# Altium schematic symbol library GyokuRe.SchLib: 1131 symbols (part 3 of 8) (continued)
## CON.header 2x20 (continued)
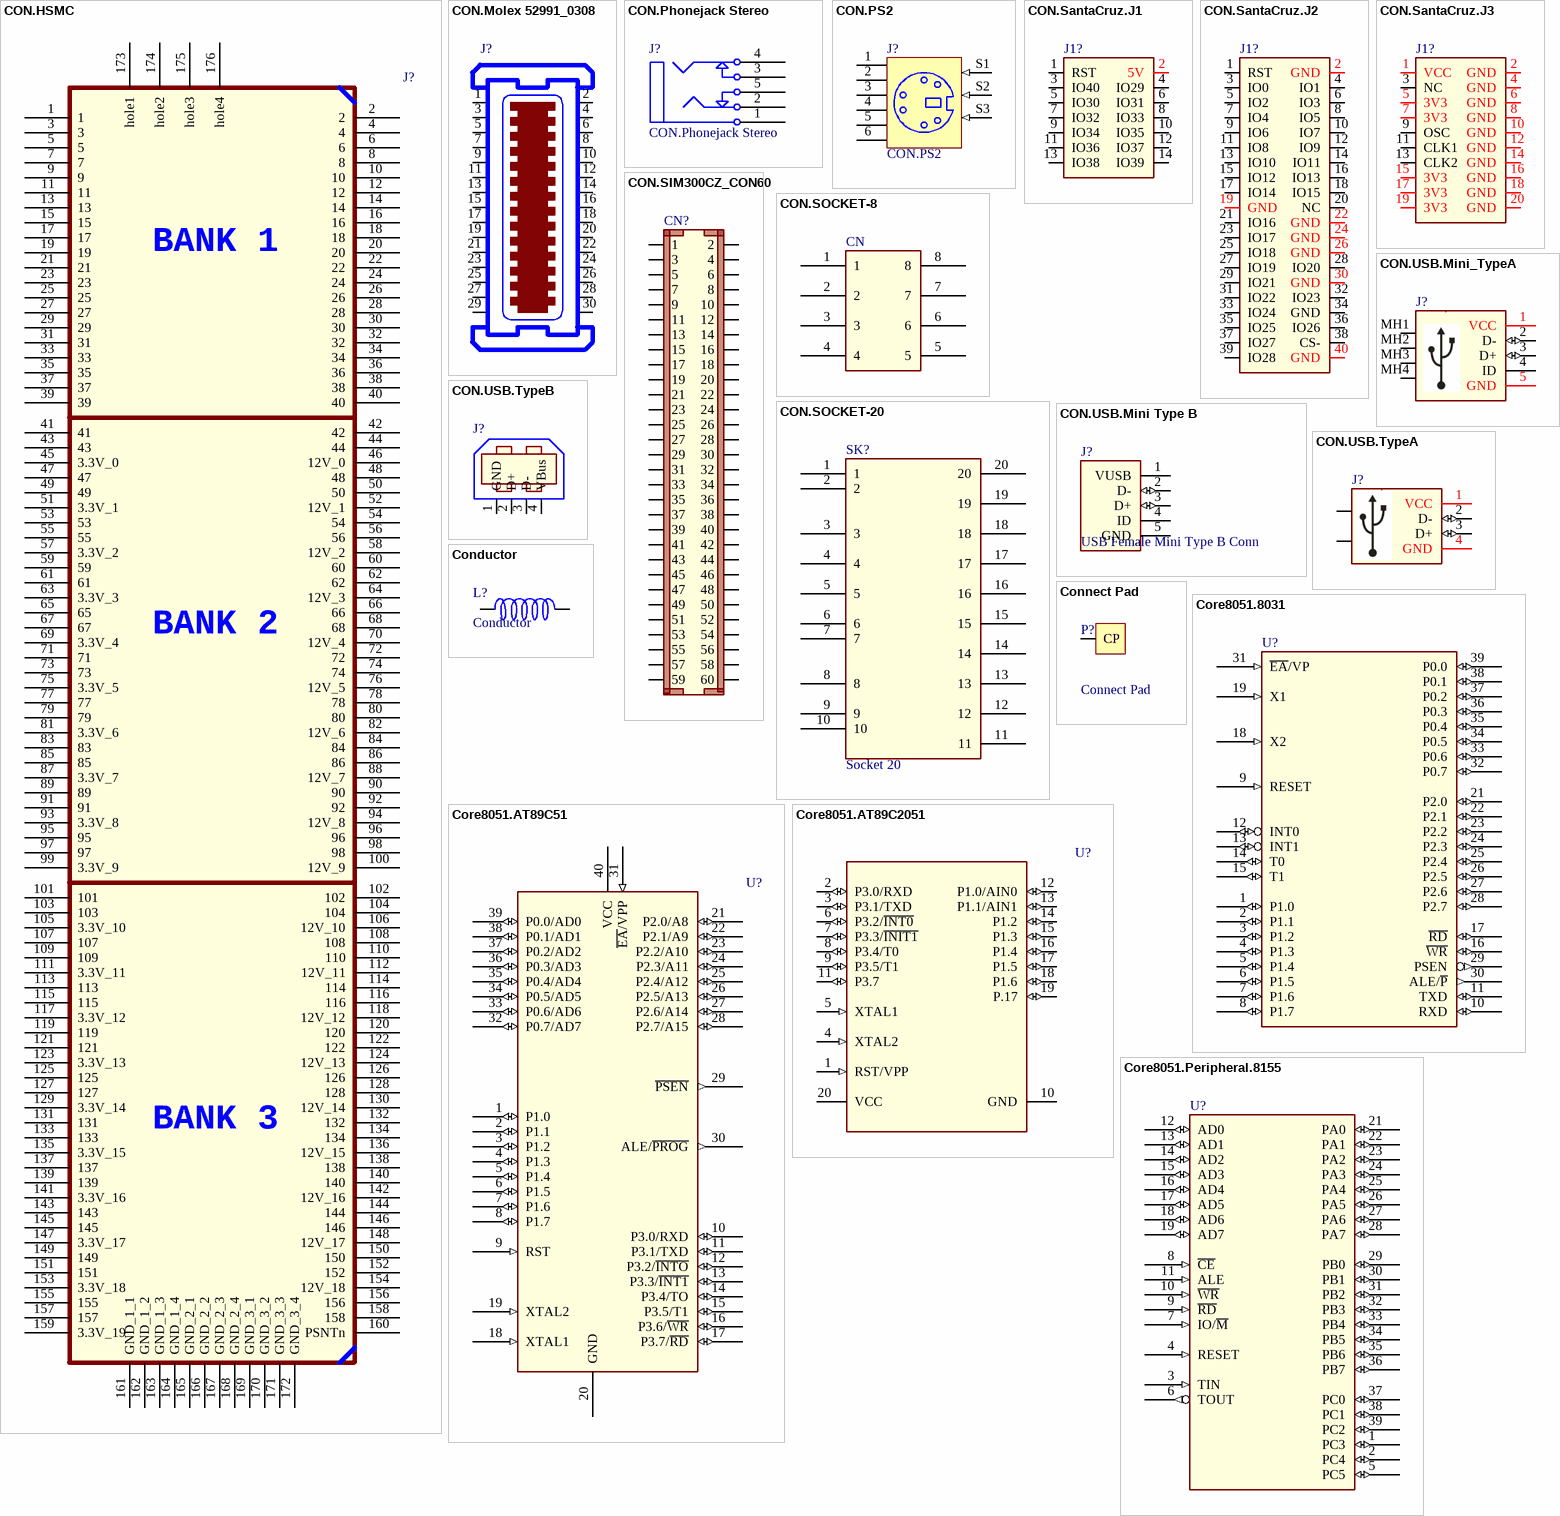
[diagram p14: symbols CON.HSMC to Core8051.Peripheral.8155]

## CON.HSMC
designator J?  (value not drawn)
HSMC Connector; Manufacturer: SamTec; Publisher: Hoang Nguyen; ComponentLink1Description: Digikey Part link; ComponentLink2Description: Open DataSheet; ComponentLink2URL: H:\LIBRARY\LIBRARY.Datasheet\
footprint CON.ASP-122952-01 (HSMC Male Connector)
pins: 1, 2, 3, 4, 5, 6, 7, 8, 9, 10, 11, 12, 13, 14, 15, 16, 17, 18, 19, 20, 21, 22, 23, 24, 25, 26, 27, 28, 29, 30, 31, 32, 33, 34, 35, 36, 37, 38, 39, 40, 41, 42, 43, 44, 45 3.3V_0, 46 12V_0, 47, 48, 49, 50, 51 3.3V_1, 52 12V_1, 53, 54, 55, 56, 57 3.3V_2, 58 12V_2, 59, 60, 61, 62, 63 3.3V_3, 64 12V_3, 65, 66, 67, 68, 69 3.3V_4, 70 12V_4, 71, 72, 73, 74, 75 3.3V_5, 76 12V_5, 77, 78, 79, 80, 81 3.3V_6, 82 12V_6, 83, 84, 85, 86, 87 3.3V_7, 88 12V_7, 89, 90, 91, 92, 93 3.3V_8, 94 12V_8, 95, 96, 97, 98, 99 3.3V_9, 100 12V_9, 101, 102, 103, 104, 105 3.3V_10, 106 12V_10, 107, 108, 109, 110, 111 3.3V_11, 112 12V_11, 113, 114, 115, 116, 117 3.3V_12, 118 12V_12, 119, 120, 121, 122, 123 3.3V_13, 124 12V_13, 125, 126, 127, 128, 129 3.3V_14, 130 12V_14, 131, 132, 133, 134, 135 3.3V_15, 136 12V_15, 137, 138, 139, 140, 141 3.3V_16, 142 12V_16, 143, 144, 145, 146, 147 3.3V_17, 148 12V_17, 149, 150, 151, 152, 153 3.3V_18, 154 12V_18, 155, 156, 157, 158, 159 3.3V_19, 160 PSNTn, 161 GND_1_1 (power), 162 GND_1_2 (power), 163 GND_1_3 (power), 164 GND_1_4 (power), 165 GND_2_1 (power), 166 GND_2_2 (power), 167 GND_2_3 (power), 168 GND_2_4 (power), 169 GND_3_1 (power), 170 GND_3_2 (power), 171 GND_3_3 (power), 172 GND_3_4 (power), 173 hole1, 174 hole2, 175 hole3, 176 hole4
text: BANK 1; BANK 2; BANK 3

## CON.Molex 52991_0308
designator J?  (value not drawn)
0.50mm (.020") Pitch SlimStack(TM) Receptacle, Surface Mount, Dual Row, Vertical; Manufacturer: Molex Corporation; Manufacturer P/N: 52991-0308; Voltage - Maximum: 50V; Current - Maximum: 500mA; Vendor: Digikey; Vendor P/N: 52991-0308-ND; Publisher: Hoang Nguyen; Temperature Range - Operating: -40°C to +105°C; Termination Interface: Surface Mount; ComponentLink1Description: Digikey Part link; ComponentLink1URL: http://search.digikey.com/scripts/DkSearch/dksus.dll?Detail&name=52991-0308-ND; ComponentLink2URL: http://www.molex.com/molex/products/datasheet.jsp?part=active/0529910308_PCB_RECEPTACLES.xml&channel=Products&Lang=en-US; ComponentLink2Description: Manufacture Link
footprint CON.Molex 52991_0308 (0.50mm (.020") Pitch SlimStack(TM) Receptacle, Surface Mount, Dual Row, Vertical)
pins: 1, 2, 3, 4, 5, 6, 7, 8, 9, 10, 11, 12, 13, 14, 15, 16, 17, 18, 19, 20, 21, 22, 23, 24, 25, 26, 27, 28, 29, 30

## CON.Phonejack Stereo
designator J?
3.5mm Audio Jack, Stereo; Published: 5-Jan-2004; DatasheetDocument: 07-Mar-2000; Publisher: Altium Limited; Mounting Type: Through Hole; ComponentLink1Description: Digikey Part link; ComponentLink2Description: Open DataSheet; ComponentLink2URL: H:\LIBRARY\LIBRARY.Datasheet\
footprint ST-3150-5N (Stereo Jack, 3.5mm, 5 Position)
pcadlib ST-3150-5N (Stereo Jack, 3.5mm, 5 Position)
pins: 1, 1A, 1B, 2, 2A, 2B, 3, 3A, 3B, 4, 4A, 4B, 5, 5A, 5B

## CON.PS2
designator J?
6 Pin Through Hole PS2 Socket (Kycon P/N); Published: 5-Jan-2004; Publisher: Altium Limited; ComponentLink1Description: Digikey Part link; ComponentLink2Description: Open DataSheet; ComponentLink2URL: H:\LIBRARY\LIBRARY.Datasheet\
footprint PS2-6PIN (PS2 Socket, 6 Pin, Through Hole)
pcadlib PS2-6PIN (PS2 Socket, 6 Pin, Through Hole)
pins: 1 KBD "Keyboard Data", 2 MSD "Mouse Data", 3 GND (power), 4 VCC (power), 5 KBC "Keyboard Clock", 6 MSC "Mouse Clk", S1 (in) "Shield", S2 (in) "Shield", S3 (in) "Shield"

## CON.SantaCruz.J1
designator J1?  (value not drawn)
SantaCruz.J1; Publisher: Hoang Nguyen; ComponentLink1Description: Digikey Part link; ComponentLink2Description: Open DataSheet; ComponentLink2URL: H:\LIBRARY\LIBRARY.Datasheet\
footprint HDR2X7
pins: 1 RST, 2 5V, 3 IO40, 4 IO29, 5 IO30, 6 IO31, 7 IO32, 8 IO33, 9 IO34, 10 IO35, 11 IO36, 12 IO37, 13 IO38, 14 IO39

## CON.SantaCruz.J2
designator J1?  (value not drawn)
SantaCruz.J2; Publisher: Hoang Nguyen; ComponentLink1Description: Digikey Part link; ComponentLink2Description: Open DataSheet; ComponentLink2URL: H:\LIBRARY\LIBRARY.Datasheet\
footprint HDR2X20
pins: 1 RST, 2 GND, 3 IO0, 4 IO1, 5 IO2, 6 IO3, 7 IO4, 8 IO5, 9 IO6, 10 IO7, 11 IO8, 12 IO9, 13 IO10, 14 IO11, 15 IO12, 16 IO13, 17 IO14, 18 IO15, 19 GND, 20 NC, 21 IO16, 22 GND, 23 IO17, 24 GND, 25 IO18, 26 GND, 27 IO19, 28 IO20, 29 IO21, 30 GND, 31 IO22, 32 IO23, 33 IO24, 34 GND, 35 IO25, 36 IO26, 37 IO27, 38 CS-, 39 IO28, 40 GND

## CON.SantaCruz.J3
designator J1?  (value not drawn)
SantaCruz.J3; Publisher: Hoang Nguyen; ComponentLink1Description: Digikey Part link; ComponentLink2Description: Open DataSheet; ComponentLink2URL: H:\LIBRARY\LIBRARY.Datasheet\
footprint HDR2X10
pins: 1 VCC, 2 GND, 3 NC, 4 GND, 5 3V3, 6 GND, 7 3V3, 8 GND, 9 OSC, 10 GND, 11 CLK1, 12 GND, 13 CLK2, 14 GND, 15 3V3, 16 GND, 17 3V3, 18 GND, 19 3V3, 20 GND

## CON.SIM300CZ_CON60
designator CN?  (value not drawn)
60 pins SIM300CZ; Publisher: Hoang Nguyen; ComponentLink1Description: Digikey Part link; ComponentLink2Description: Open DataSheet; ComponentLink2URL: H:\LIBRARY\LIBRARY.Datasheet\
footprint ASTRON 1590060-093
pins: 1, 2, 3, 4, 5, 6, 7, 8, 9, 10, 11, 12, 13, 14, 15, 16, 17, 18, 19, 20, 21, 22, 23, 24, 25, 26, 27, 28, 29, 30, 31, 32, 33, 34, 35, 36, 37, 38, 39, 40, 41, 42, 43, 44, 45, 46, 47, 48, 49, 50, 51, 52, 53, 54, 55, 56, 57, 58, 59, 60

## CON.SOCKET-8
designator CN, comment Socket 8  (value not drawn)
ComponentLink1Description: Digikey Part link; ComponentLink2Description: Open DataSheet; ComponentLink2URL: H:\LIBRARY\LIBRARY.Datasheet\
footprint IC8N (Footprint not found)
pins: 1, 2, 3, 4, 5, 6, 7, 8

## CON.SOCKET-20
designator SK?, comment Socket 20
ComponentLink1Description: Digikey Part link; ComponentLink2Description: Open DataSheet; ComponentLink2URL: H:\LIBRARY\LIBRARY.Datasheet\
footprint IC20N
pins: 1, 2, 3, 4, 5, 6, 7, 8, 9, 10, 11, 12, 13, 14, 15, 16, 17, 18, 19, 20

## CON.USB.Mini Type B
designator J?, comment USB Female Mini Type B Conn
USB Mini Type B Conn; Vendor: Digikey; Published: 13-April-2009; Publisher: Hoang Nguyen; ComponentLink1Description: Digikey Part Link; ComponentLink2Description: Open Datasheet; ComponentLink2URL: H:\LIBRARY\LIBRARY.Datasheet\
footprint USB Male Mini Type-B SMD (USB Male Mini Type B Conn)
footprint USB Mini B 1 (USB Male Mini Type B Conn)
pins: 1 VUSB (power), 2 D- (io), 3 D+ (io), 4 ID "Mini Type B - Not connected", 5 GND (power)

## CON.USB.Mini_TypeA
designator J?  (value not drawn)
Mini USB Type A Connector; Publisher: Hoang Nguyen; ComponentLink1Description: Digikey Part link; ComponentLink2Description: Open DataSheet; ComponentLink2URL: H:\LIBRARY\LIBRARY.Datasheet\
footprint USB Type A (Footprint not found)
pins: 1 VCC (power), 2 D- (io), 3 D+ (io), 4 ID (power) "Mini Type A - Connected to GND", 5 GND (power), MH1, MH2, MH3, MH4

## CON.USB.TypeA
designator J?  (value not drawn)
Type-A USB Connector; Publisher: Hoang Nguyen; ComponentLink1Description: Digikey Part link; ComponentLink2Description: Open DataSheet; ComponentLink2URL: H:\LIBRARY\LIBRARY.Datasheet\
footprint USB Male Type-A (USB Male Type A Connector)
pins: 1 VCC (power), 2 D- (io), 3 D+ (io), 4 GND (power), SHIELD, SHIELD

## CON.USB.TypeB
designator J?, comment USB Type B Conn  (value not drawn)
Vendor: Digikey; Published: 13-April-2009; Publisher: Hoang Nguyen; ComponentLink1Description: Digikey Part Link; ComponentLink2Description: Open Datasheet; ComponentLink2URL: H:\LIBRARY\LIBRARY.Datasheet\
footprint USB Male Type-B (USB Male Type B Connector)
footprint USB TypeB 2 (USB Male Type B Connector)
pins: 1 GND, 2 D+, 3 D-, 4 VBus

## Conductor
designator L?
footprint CUON CAM 200mil
pins: 1, 2

## Connect Pad
designator P?
Connect Pad, 1-Pin; LatestRevisionDate: 17-Jul-2002; LatestRevisionNote: Re-released for DXP Platform.; Publisher: Altium Limited
footprint CP (Connect Pad, 1-Pin)
pins: 1 CP

## Core8051.8031
designator U?  (value not drawn)
Intel 8031; Flash: Kb; SRAM: Bytes; Volt: V; CPU Speed (MIPS): 0 MIPS; Publisher: Hoang Nguyen; ComponentLink1Description: Degikey Part link; ComponentLink2Description: Open DataSheet; ComponentLink2URL: H:\LIBRARY\LIBRARY.Datasheet\
pins: 1 P1.0 (io), 2 P1.1 (io), 3 P1.2 (io), 4 P1.3 (io), 5 P1.4 (io), 6 P1.5 (io), 7 P1.6 (io), 8 P1.7 (io), 9 RESET (in), 10 RXD (io), 11 TXD (io), 12 INT0 (io), 13 INT1 (io), 14 T0 (io), 15 T1 (io), 16 ~{WR} (io), 17 ~{RD} (io), 18 X2 (in), 19 X1 (in), 20 VSS (power) hidden to VSS, 21 P2.0 (io), 22 P2.1 (io), 23 P2.2 (io), 24 P2.3 (io), 25 P2.4 (io), 26 P2.5 (io), 27 P2.6 (io), 28 P2.7 (io), 29 PSEN (out), 30 ALE/~{P} (out), 31 ~{EA}/VP (in), 32 P0.7 (io), 33 P0.6 (io), 34 P0.5 (io), 35 P0.4 (io), 36 P0.3 (io), 37 P0.2 (io), 38 P0.1 (io), 39 P0.0 (io), 40 VCC (power) hidden to VCC

## Core8051.AT89C51
designator U?  (value not drawn)
Atmel MCU; Flash: Kb; SRAM: Bytes; Volt: V; CPU Speed (MIPS): 0 MIPS; ComponentLink1Description: Degikey Part link; ComponentLink2Description: Open DataSheet; ComponentLink2URL: H:\LIBRARY\LIBRARY.Datasheet\; Publisher: Hoang Nguyen
footprint DIP600-40 (DIP, Plastic; 40 Leads; Row Spacing 15.24 mm; Pitch 2.54 mm)
pins: 1 P1.0 (io), 2 P1.1 (io), 3 P1.2 (io), 4 P1.3 (io), 5 P1.4 (io), 6 P1.5 (io), 7 P1.6 (io), 8 P1.7 (io), 9 RST (in), 10 P3.0/RXD (io), 11 P3.1/TXD (io), 12 P3.2/~{INTO} (io), 13 P3.3/~{INT1} (io), 14 P3.4/TO (io), 15 P3.5/T1 (io), 16 P3.6/~{WR} (io), 17 P3.7/~{RD} (io), 18 XTAL1 (in), 19 XTAL2 (in), 20 GND (power), 21 P2.0/A8 (io), 22 P2.1/A9 (io), 23 P2.2/A10 (io), 24 P2.3/A11 (io), 25 P2.4/A12 (io), 26 P2.5/A13 (io), 27 P2.6/A14 (io), 28 P2.7/A15 (io), 29 ~{PSEN} (out), 30 ALE/~{PROG} (out), 31 ~{EA}/VPP (in), 32 P0.7/AD7 (io), 33 P0.6/AD6 (io), 34 P0.5/AD5 (io), 35 P0.4/AD4 (io), 36 P0.3/AD3 (io), 37 P0.2/AD2 (io), 38 P0.1/AD1 (io), 39 P0.0/AD0 (io), 40 VCC (power)

## Core8051.AT89C2051
designator U?  (value not drawn)
Atmel MCU; Flash: Kb; SRAM: Bytes; Volt: V; CPU Speed (MIPS): 0 MIPS; Publisher: Hoang Nguyen; ComponentLink1Description: Degikey Part link; ComponentLink2Description: Open DataSheet; ComponentLink2URL: H:\LIBRARY\LIBRARY.Datasheet\AT89C2051.pdf
footprint DIP20
pins: 1 RST/VPP (in), 2 P3.0/RXD (io), 3 P3.1/TXD (io), 4 XTAL2 (in), 5 XTAL1 (in), 6 P3.2/~{INT0} (io), 7 P3.3/~{INIT1} (io), 8 P3.4/T0 (io), 9 P3.5/T1 (io), 10 GND (power), 11 P3.7 (io), 12 P1.0/AIN0 (io), 13 P1.1/AIN1 (io), 14 P1.2 (io), 15 P1.3 (io), 16 P1.4 (io), 17 P1.5 (io), 18 P1.6 (io), 19 P.17 (io), 20 VCC (power)

## Core8051.Peripheral.8155
designator U?  (value not drawn)
Mo rong Port song song; Flash: Kb; SRAM: Bytes; Volt: V; CPU Speed (MIPS): 0 MIPS; Publisher: Hoang Nguyen; ComponentLink1Description: Degikey Part link; ComponentLink2Description: Open DataSheet; ComponentLink2URL: H:\LIBRARY\LIBRARY.Datasheet\
pins: 1 PC3 (io), 2 PC4 (io), 3 TIN (in), 4 RESET (in), 5 PC5 (io), 6 TOUT (out), 7 IO/~{M} (in), 8 ~{CE} (in), 9 ~{RD} (in), 10 ~{WR} (in), 11 ALE (in), 12 AD0 (io), 13 AD1 (io), 14 AD2 (io), 15 AD3 (io), 16 AD4 (io), 17 AD5 (io), 18 AD6 (io), 19 AD7 (io), 20 VSS (power) hidden to VSS, 21 PA0 (io), 22 PA1 (io), 23 PA2 (io), 24 PA3 (io), 25 PA4 (io), 26 PA5 (io), 27 PA6 (io), 28 PA7 (io), 29 PB0 (io), 30 PB1 (io), 31 PB2 (io), 32 PB3 (io), 33 PB4 (io), 34 PB5 (io), 35 PB6 (io), 36 PB7 (io), 37 PC0 (io), 38 PC1 (io), 39 PC2 (io), 40 VCC (power) hidden to VCC

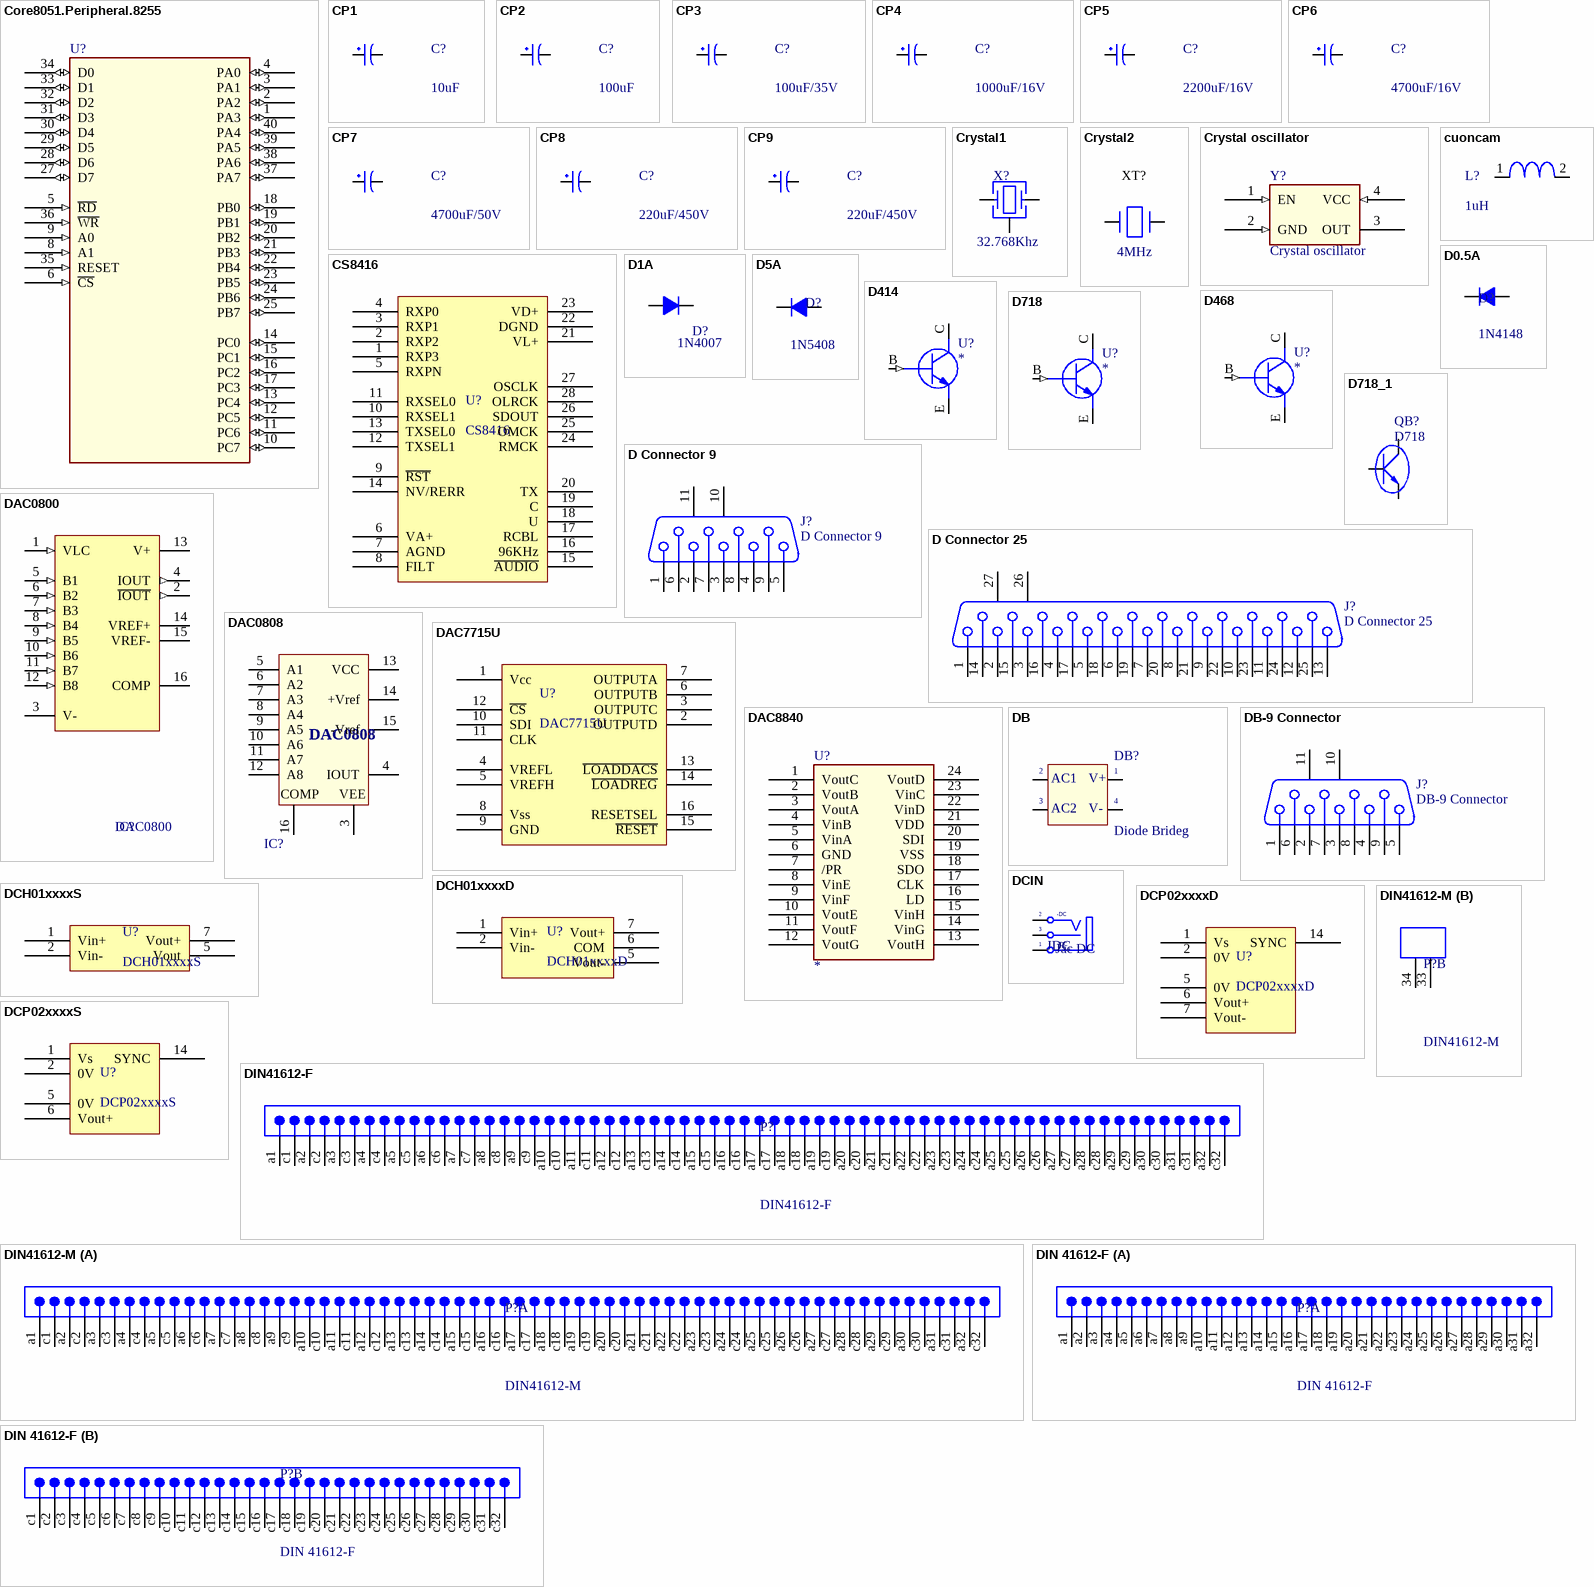
[diagram p15: symbols Core8051.Peripheral.8255 to DIN 41612-F]

## Core8051.Peripheral.8255
designator U?  (value not drawn)
Mo rong Port xuat nhap song song; Flash: Kb; SRAM: Bytes; Volt: V; CPU Speed (MIPS): 0 MIPS; Publisher: Hoang Nguyen; ComponentLink1Description: Degikey Part link; ComponentLink2Description: Open DataSheet; ComponentLink2URL: H:\LIBRARY\LIBRARY.Datasheet\
pins: 1 PA3 (io), 2 PA2 (io), 3 PA1 (io), 4 PA0 (io), 5 ~{RD} (in), 6 ~{CS} (in), 7 GND (power) hidden to GND, 8 A1 (in), 9 A0 (in), 10 PC7 (io), 11 PC6 (io), 12 PC5 (io), 13 PC4 (io), 14 PC0 (io), 15 PC1 (io), 16 PC2 (io), 17 PC3 (io), 18 PB0 (io), 19 PB1 (io), 20 PB2 (io), 21 PB3 (io), 22 PB4 (io), 23 PB5 (io), 24 PB6 (io), 25 PB7 (io), 26 VCC (power) hidden to VCC, 27 D7 (io), 28 D6 (io), 29 D5 (io), 30 D4 (io), 31 D3 (io), 32 D2 (io), 33 D1 (io), 34 D0 (io), 35 RESET (in), 36 ~{WR} (in), 37 PA7 (io), 38 PA6 (io), 39 PA5 (io), 40 PA4 (io)

## CP1
designator C?, comment 10uF
Cap P  0,1uF < 22uF , 16 - 50V; Value: 10uF/50V; Description 1: 10 => 220uF/6,3V/10V - 10uF => 100uF/16V; Description 2: 0,1uF => 33uF/50V - 10uF => 22uF/63V; Description 3: 0,47uF => 10uF/100V
footprint CP1/2 (Tu hoa < 22uF/16>50V)
pins: 1, 2
1 alternate drawing of the same symbol

## CP2
designator C?, comment 100uF
C 47uF/50V , 220uF/16V; Value: 47uF/16 - 50V; Description 1: 470uF/6,3V - 330uF/10V - 220uF/16V; Description 2: 100uF/25V - 35V - 47uF/50V - 22uF/100V; Description 3: 33uF => 47uF/63V - 1uF => 4,7uF/160V; Description 4: 1uF => 2,2uF/250V - 1uF/350V
footprint CP1/2.5 (Tu hoa 33 >100 uF,50V, 220uF/16V,25V)
pins: 1, 2

## CP3
designator C?, comment 100uF/35V
Cap 100uF/35V - 470uF/16V; Value: 100uF/35V/50V; Description 1: 1000uF/6,3V - 470uF/16V - 330uF - 25V; Description 2: 220uF/35V - 100uF/50V - 63V - 4,7uF/200V; Description 3: 22uF => 33uF100V - 3,3uF => 4,7uF/250V; Description 4: 2,2uF =>3,3uF/350 - 2,2uF/400V - 1uF/450V
footprint CP1.5/3.4 (Tu hoa 220->470uF,16V, 470uF/16V,25V)
pins: 1, 2

## CP4
designator C?, comment 1000uF/16V
Cap 1000uF/16V - 220uF/50V; Description 5: 4,7uF>10uF/250V_3,3uF>10uF/400V - 2,2uF>4,7uF/450V; Description 1: 2200uF-3300uF/6,3V - 1000uF-2200uF/10V; Description 2: 1000uF/16V - 470uF => 1000uF/25V - 100uF/100V; Description 3: 330uF>470uF/35V_220uF>470uF/50V_10uF>22uF/250V; Description 4: 220uF => 330uF/63V - 10uF =>33uF/160 - 200V; Value: 1000uF/16V
footprint CP1.5/3.4 (Tu hoa 220->470uF,16V, 470uF/16V,25V)
pins: 1, 2

## CP5
designator C?, comment 2200uF/16V
Cap 2200uF/16V - 1000uF/50V; Description 5: 47uF/200V - 22uF/350V - 400V - 10uF/450V; Description 1: 4700uF-6800uF/6,3V - 3300uF-4700uF/10V; Description 2: 2200uF-3300uF/16V - 470uF => 2200uF/25V; Description 3: 1000uF/35V-50V_470uF/63V_220uF>330uF/100V; Description 4: 47uF => 100uF/160V - 33uF-47uF/250V; Value: 2200uF/16V
footprint CP2/4 (Tu hoa 1000uF/16V/25V)
pins: 1, 2

## CP6
designator C?, comment 4700uF/16V
Cap 4700uF/16V - 2200uF/50V; Description 5: 100uF=>220uF/200V -100uF=>330uF/350V; Description 1: 10KuF=>22KuF/6,3V - 6800uF=>15KuF/10V; Description 2: 4700uF=>10KuF/16V - 3300uF => 6800uF/25V; Description 3: 2200uF=>3300uF/50V_1KuF=>2200uF/63V; Description 4: 470uF => 1KuF/100V - 220uF-470uF/160V; Value: 2200uF/16V; Description 6: 33uF=>100/350V-400V  -  22uF=>33uF/450V
footprint CP3/7 (Tu hoa 4700uF/25V)
pins: 1, 2

## CP7
designator C?, comment 4700uF/50V
Cap 4700uF/50V; Value: 4700uF/50V
footprint CP4/8.5 (Tu hoa 4700uF/50V)
pins: 1, 2

## CP8
designator C?, comment 220uF/450V
Cap 4700uF/50V; Value: 220uF/450V
footprint CP4/12 (Tu hoa 220uF/450V)
pins: 1, 2

## CP9
designator C?, comment 220uF/450V
Cap 10000uF/63V; Value: 220uF/450V
footprint CP4.5/19 (Tu hoa 10,000uF/63V)
pins: 1, 2

## Crystal1
designator X?  value 32.768Khz
Tuning Forl Crystal Units (SMD-Cylinder Type); Vendor: Digikey; ComponentLink1URL: http://search.digikey.com/scripts/DkSearch/dksus.dll?Detail&name=300-2066-1-ND; ComponentLink1Description: Digikey Part Link; ComponentLink2URL: H:\LIBRARY\LIBRARY.Datasheet\k-cmr.pdf; ComponentLink2Description: Open Datasheet; Publisher: Hoang Nguyen; Published: 13-April-2009
footprint Crystal cylinder (Crystal footsprint type 1)
pins: 1, 2, 3 GND

## Crystal2
designator XT?  value 4MHz  (hidden comment: *)
Quarz Crystal; Vendor: Digikey; Published: 13-April-2009; Publisher: Hoang Nguyen; ComponentLink1Description: Digikey Part Link; ComponentLink2Description: Open Datasheet; ComponentLink2URL: H:\LIBRARY\LIBRARY.Datasheet\; Price: 2000 VND
footprint Crystal.HC49/USxx (HC49USxx package)
footprint Crystal.HC49/U (HC49U package)
footprint Crystal.HC49_N (HC49USxx package)
footprint Crystal.smd_N (HC49USxx package)
pins: 1, 2

## Crystal oscillator
designator Y?
Crystal oscillator - TTL; ComponentLink1Description: Digikey Part Link; ComponentLink2Description: Open Datasheet; ComponentLink2URL: H:\LIBRARY\LIBRARY.Datasheet\
footprint OSC - DIP8
footprint OSC - DIP14
pins: 1 EN (in), 2 GND (in), 3 OUT, 4 VCC (in)

## CS8416
designator U?
192 kHz Digital Audio Interface Receiver
footprint DIP-28W (DIP; 28 Leads; Row Spacing 15.24 mm; Pitch 2.54 mm)
footprint SOIC-28W (SOIC, 28-Leads, Body 17.9x7.5mm, Pitch 1.27mm, IPC Low Density)
pins: 1 RXP3, 2 RXP2, 3 RXP1, 4 RXP0, 5 RXPN, 6 VA+, 7 AGND, 8 FILT, 9 ~{RST}, 10 RXSEL1, 11 RXSEL0, 12 TXSEL1, 13 TXSEL0, 14 NV/RERR, 15 ~{AUDIO}, 16 96KHz, 17 RCBL, 18 U, 19 C, 20 TX, 21 VL+, 22 DGND, 23 VD+, 24 RMCK, 25 OMCK, 26 SDOUT, 27 OSCLK, 28 OLRCK

## cuoncam
designator L?, comment 1uH
pins: 1, 2

## D0.5A
designator D?, comment 1N4148
D0.5A; Value: 1N4148
footprint D0.5A (Diode muoi, W 80mil, L 300mil)
pins: 1 A, 2 K

## D1A
designator D?, comment 1N4007
Diode 1A; Value: 1N4007
footprint D1A (Diode 1A, W 100mil, L 350mil)
footprint D2A (Diode 2A, W 150mil, L 450mil)
pins: 1 A, 2 K

## D5A
designator D?, comment 1N5408
Diode 5A; Value: 1N5408
footprint D5A (Diode 5A, W 200mil, L 550mil)
footprint D5AN (Diode 5A, W 200mil, L 250mil)
pins: 1 A, 2 K

## D414
designator U?
NPN Bipolar Transistor; Vendor: Digikey; Published: 13-April-2009; Publisher: Hoang Nguyen; ComponentLink1Description: Digikey Part Link; ComponentLink2Description: Open Datasheet; ComponentLink2URL: H:\LIBRARY\LIBRARY.Datasheet\
pins: B BASE (in), C COLLECTOR, E EMITOR

## D468
designator U?
NPN Bipolar Transistor; Vendor: Digikey; Published: 13-April-2009; Publisher: Hoang Nguyen; ComponentLink1Description: Digikey Part Link; ComponentLink2Description: Open Datasheet; ComponentLink2URL: H:\LIBRARY\LIBRARY.Datasheet\
pins: B BASE (in), C COLLECTOR, E EMITOR

## D718
designator U?
NPN Bipolar Transistor; Vendor: Digikey; Published: 13-April-2009; Publisher: Hoang Nguyen; ComponentLink1Description: Digikey Part Link; ComponentLink2Description: Open Datasheet; ComponentLink2URL: H:\LIBRARY\LIBRARY.Datasheet\
pins: B BASE (in), C COLLECTOR, E EMITOR

## D718_1
designator QB?, comment D718
Transistor Power Supply; Value: D718
footprint QTO-247 (TO-247)
pins: 1 B, 2 C, 3 E

## D Connector 9
designator J?
Receptacle Assembly, 9 Position, Right Angle; PackageDocument: O; Positions: 9; Published: 15-Jun-2001; LatestRevisionDate: 17-Jul-2002; LatestRevisionNote: Re-released for DXP Platform.; DatasheetDocument: 1-Sep-1999; PackageReference: 788750; Publisher: Altium Limited; Orientation: Right Angle; Gender: Receptacle
footprint DSUB1.385-2H9 (Connector; D Subminiature; 9 Position; Right Angle; Pitch 1.385 mm)
signal-integrity model Connector
pins: 1, 2, 3, 4, 5, 6, 7, 8, 9, 10 MH1, 11 MH2

## D Connector 25
designator J?
Receptacle Assembly, 25 Position, Right Angle; PackageDocument: U; Positions: 25; Published: 15-Jun-2001; LatestRevisionDate: 17-Jul-2002; LatestRevisionNote: Re-released for DXP Platform.; DatasheetDocument: 19-Mar-1999; PackageReference: 787202; Publisher: Altium Limited; Orientation: Right Angle; Gender: Receptacle
footprint DSUB1.385-2H25A (Connector; D Subminiature; 25 Position; Right Angle; Pitch 1.385 mm)
signal-integrity model Connector
3D model SW3dPS-d-sub25_connector (PCB3D Model)
pins: 1, 2, 3, 4, 5, 6, 7, 8, 9, 10, 11, 12, 13, 14, 15, 16, 17, 18, 19, 20, 21, 22, 23, 24, 25, 26 MH1, 27 MH2

## DAC0800
designator IC?
8-Bit Digital-to-Analog Converter; Value: DAC0800
footprint DIP16/W0.3 (16 PIN, W 300mil, Pin to pin 100mil)
pins: 1 VLC (in), 2 ~{IOUT} (out), 3 V- (power), 4 IOUT (out), 5 B1 (in), 6 B2 (in), 7 B3 (in), 8 B4 (in), 9 B5 (in), 10 B6 (in), 11 B7 (in), 12 B8 (in), 13 V+ (power), 14 VREF+, 15 VREF-, 16 COMP

## DAC0808
designator IC?
8 Bits Digital Analog Convert; Value: DAC0808
footprint DIP16/W0.3 (16 PIN, W 300mil, Pin to pin 100mil)
pins: 2 GND (power) hidden to GND, 3 VEE, 4 IOUT, 5 A1, 6 A2, 7 A3, 8 A4, 9 A5, 10 A6, 11 A7, 12 A8, 13 VCC (power), 14 +Vref, 15 -Vref, 16 COMP
2 alternate drawings of the same symbol

## DAC7715U
designator U?
4 Channel, 12-Bit Voltage Output D/A Converter
footprint SOIC-16N (SOIC, 16-Leads, Body 9.9x3.9mm, Pitch 1.27mm, IPC High Density)
pins: 1 Vcc, 2 OUTPUTD, 3 OUTPUTC, 4 VREFL, 5 VREFH, 6 OUTPUTB, 7 OUTPUTA, 8 Vss, 9 GND, 10 SDI, 11 CLK, 12 ~{CS}, 13 ~{LOADDACS}, 14 ~{LOADREG}, 15 ~{RESET}, 16 RESETSEL

## DAC8840
designator U?
Digital to Analog Converter; Vendor: Digikey; Published: 13-April-2009; Publisher: Hoang Nguyen; ComponentLink1Description: Digikey Part Link; ComponentLink2Description: Open Datasheet; ComponentLink2URL: H:\LIBRARY\LIBRARY.Datasheet\
pins: 1 VoutC, 2 VoutB, 3 VoutA, 4 VinB, 5 VinA, 6 GND (power), 7 /PR, 8 VinE, 9 VinF, 10 VoutE, 11 VoutF, 12 VoutG, 13 VoutH, 14 VinG, 15 VinH, 16 LD, 17 CLK, 18 SDO, 19 VSS (power), 20 SDI, 21 VDD (power), 22 VinD, 23 VinC, 24 VoutD